# Altium footprint library Footprints.PcbLib: 236 footprints (part 7 of 15)
Each footprint in its own frame and in the unit in brackets; x right, y up, seen from the top. Pads: shape width x height; smd on the part's side, far side on the other; paste and mask are expansions set on the pad; w line width, h text height; cw(c..) or ccw(c..) is an arc to the next point about the centre after c.
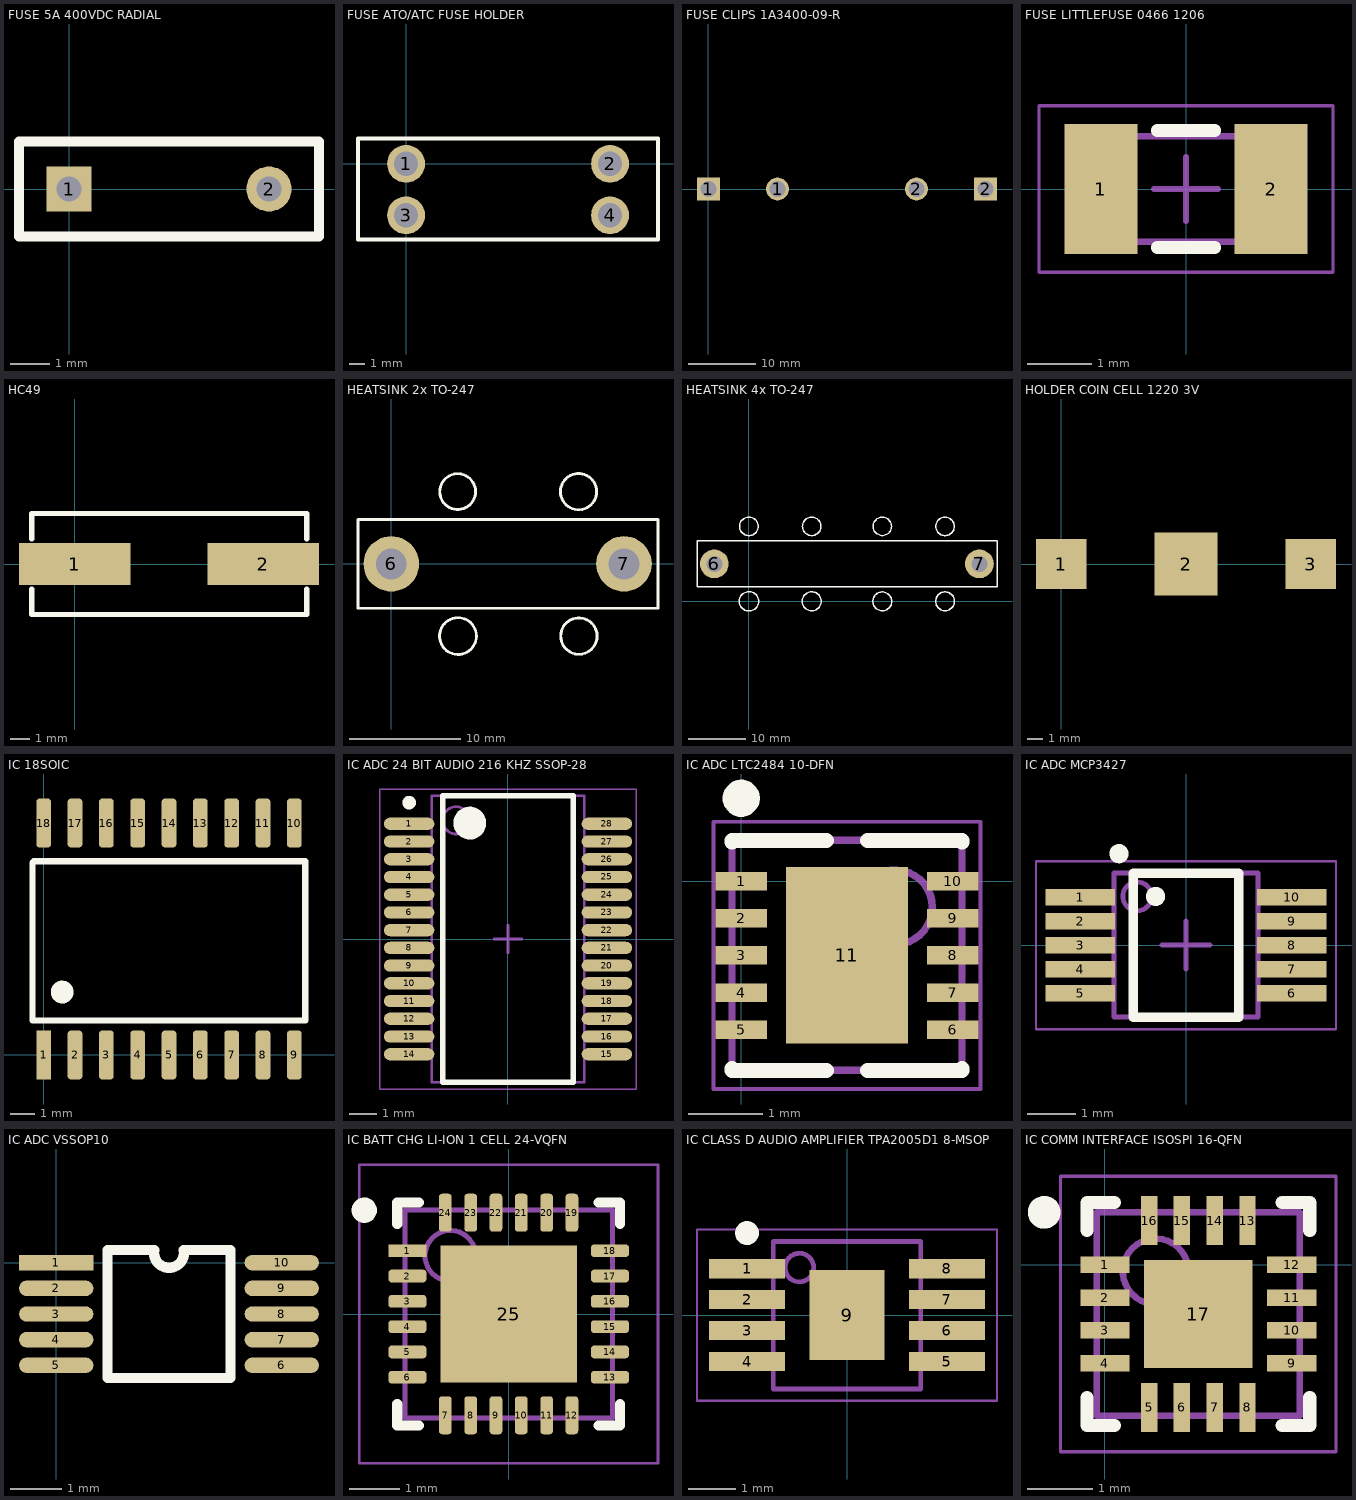
[diagram p6: the footprints below, top view; thin cyan lines are the x and y axes]

## FUSE 5A 400VDC RADIAL [mil]
pads (2):
  rect 45x45 hole 25: 1(0,0)
  round 45 hole 25: 2(200,0)
Top Overlay:
  lines w10: -50,-47.5 250,-47.5 250,47.5 -50,47.5 -50,-47.5
3D body: height 40, standoff -80, extent 190.09,-9.97 210.01,9.99
3D body: height 40, standoff -80, extent -9.91,-9.97 10.01,9.99
3D body: height 320, standoff 25, extent -55,-52.5 255,52.5

## FUSE ATO/ATC FUSE HOLDER [mm]
pads (4):
  round 2.5 hole 1.6: 1(0,0) 2(13.47,0) 3(0,-3.4) 4(13.47,-3.4)
Top Overlay:
  lines w0.254: -3.18,-4.995 16.64,-4.995 16.64,1.585 ; -3.17,-4.995 -3.17,1.665 16.64,1.665
3D body "keystone-PN3557-2.STEP": height 7.54, standoff -2.62, extent -3.234,-4.983 16.578,1.748
3D body "fuse-automotive-10a.STEP": height 19.1, standoff 0.1, extent -2.3,-4.1 15.7,0.7

## FUSE CLIPS 1A3400-09-R [mm] "FUSE CLIP CARTRIDGE 20A PCB"
pads (4):
  rect 3.4x3.4 hole 2.35: 1(0,0) 2(41.28,0)
  round 3.4 hole 2.35: 1(10.29,0) 2(30.99,0)
3D body: height 18.03, standoff 0, extent 0,-6 41.28,6

## FUSE LITTLEFUSE 0466 1206 [mm]
height 0.6
pads (2):
  rect 1.14x2.03 smd: 1(-1.33,0) 2(1.33,0)
Top Overlay:
  lines w0.2: -0.45,-0.915 0.45,-0.915 ; -0.45,0.915 0.45,0.915
Mechanical 13:
  lines w0.1: -1.65,-0.825 -1.65,0.825 1.65,0.825 1.65,-0.825 -1.65,-0.825
Mechanical 15:
  lines w0.05: -2.3,-1.3 -2.3,1.3 2.3,1.3 2.3,-1.3 -2.3,-1.3
  lines w0.1: -0.5,0 0.5,0 ; 0,-0.5 0,0.5
3D body "FUSE LITTLEFUSE 0466 1206.step": height 0.6, standoff 0, extent -1.65,-0.825 1.65,0.825

## HC49 [mm]
pads (2):
  rect 5.6x2.1 smd: 1(0,0) 2(9.5,0)
Top Overlay:
  lines w0.254: -2.159,-1.27 -2.159,-2.54 11.684,-2.54 11.684,-1.27 ; -2.159,1.27 -2.159,2.54 11.684,2.54 11.684,1.27

## HEATSINK 2x TO-247 [mm]
pads (2):
  round 5 hole 2.775: 6(0,0) 7(20.94,0)
Top Overlay:
  circle w0.254: c5.97,6.5 r1.61
  circle w0.254: c16.85,6.5 r1.629
  circle w0.254: c16.88,-6.5 r1.634
  circle w0.254: c6,-6.5 r1.655
  lines w0.254: -3,-4 -3,4 24,4 24,-4 -3,-4
3D body "omni-uni-30-25-d.stp": height 59.7, standoff -4.15, extent -2,-15.1 23,14.9

## HEATSINK 4x TO-247 [mm]
pads (2):
  round 5 hole 2.775: 6(-6,6.5) 7(39.94,6.5)
Top Overlay:
  circle w0.254: c23.12,13 r1.597
  circle w0.254: c34,13 r1.603
  circle w0.254: c34,0 r1.628
  circle w0.254: c23.12,0 r1.637
  circle w0.254: c10.88,0 r1.648
  circle w0.254: c0,0 r1.676
  circle w0.254: c10.88,13 r1.598
  circle w0.254: c0,13 r1.612
  lines w0.254: -9,2.5 -9,10.5 43,10.5 43,2.5 -9,2.5
3D body "omni-uni-30-50-d.stp": height 59.7, standoff -4.15, extent -8,-8.25 42,21.75

## HOLDER COIN CELL 1220 3V [mm] "12mm smd coin cell holder"
height 3.18
pads (3):
  rect 3.18x3.18 smd: 1(0,0) 3(15.74,0)
  rect 3.96x3.96 smd: 2(7.87,0)
3D body "keystone-PN3000.STEP": height 3.43, standoff 0.26, extent -1.604,-6.921 17.344,5.144
3D body: height 0.25, standoff 0, extent 3.1,-0.9 3.1,-0.9

## IC 18SOIC [mm]
height 2
pads (18):
  rect 0.6x2 smd: 1(0,0)
  rrect50% 0.6x2 smd: 2(1.27,0) 3(2.54,0) 4(3.81,0) 5(5.08,0) 6(6.35,0) 7(7.62,0) 8(8.89,0) 9(10.16,0) 10(10.16,9.4) 11(8.89,9.4) 12(7.62,9.4) 13(6.35,9.4) 14(5.08,9.4) 15(3.81,9.4) 16(2.54,9.4) 17(1.27,9.4) 18(0,9.4)
Top Overlay:
  circle w0.254: c0.75,2.55 r0.1
  circle w0.254: c0.75,2.55 r0.335
  lines w0.254: -0.45,7.8 -0.45,1.4 10.6,1.4 10.6,7.85 -0.4,7.85
3D body "SOIC18 wide.stp": height 2, standoff 0, extent -0.625,-0.382 10.725,9.782

## IC ADC 24 BIT AUDIO 216 KHZ SSOP-28 [mm] "SOP, 28-Leads, Body 10.20x5.30mm, Pitch 0.65mm, IPC Medium Density"
height 2
pads (28):
  oval 1.85x0.45 smd: 1(-3.625,4.225) 2(-3.625,3.575) 3(-3.625,2.925) 4(-3.625,2.275) 5(-3.625,1.625) 6(-3.625,0.975) 7(-3.625,0.325) 8(-3.625,-0.325) 9(-3.625,-0.975) 10(-3.625,-1.625) 11(-3.625,-2.275) 12(-3.625,-2.925) 13(-3.625,-3.575) 14(-3.625,-4.225) 15(3.625,-4.225) 16(3.625,-3.575) 17(3.625,-2.925) 18(3.625,-2.275) 19(3.625,-1.625) 20(3.625,-0.975) 21(3.625,-0.325) 22(3.625,0.325) 23(3.625,0.975) 24(3.625,1.625) 25(3.625,2.275) 26(3.625,2.925) 27(3.625,3.575) 28(3.625,4.225)
Top Overlay:
  circle w0.25: c-3.625,5 r0.125
  circle w0.6: c-1.4,4.25 r0.3
  lines w0.2: -2.4,-5.25 -2.4,5.25 2.4,5.25 2.4,-5.25 -2.4,-5.25
Assembly Top (Mech9):
  circle w0.1: c-1.9,4.35 r0.5
  lines w0.1: -2.8,-5.25 -2.8,5.25 2.8,5.25 2.8,-5.25 -2.8,-5.25
Courtyard Top (Mech11):
  lines w0.05: -4.7,-5.5 -4.7,5.5 4.7,5.5 4.7,-5.5 -4.7,-5.5
  lines w0.1: -0.5,0 0.5,0 ; 0,-0.5 0,0.5
3D body "IC ADC 24 BIT AUDIO 216 KHZ SSOP-28.step": height 2, standoff 0, extent -3.9,-5.25 3.9,5.25

## IC ADC LTC2484 10-DFN [mm]
height 0.8
pads (11):
  rect 0.7x0.25 smd: 1(0,0) 2(0,-0.5) 3(0,-1) 4(0,-1.5) 5(0,-2) 6(2.85,-2) 7(2.85,-1.5) 8(2.85,-1) 9(2.85,-0.5) 10(2.85,0)
  rect 1.65x2.38 smd: 11(1.425,-1)
Top Overlay:
  circle w0.25: c0,1.118 r0.125
  lines w0.2: -0.125,-2.525 -0.125,-2.55 1.15,-2.55 ; -0.125,0.525 -0.125,0.55 1.15,0.55 ; 1.7,-2.55 2.975,-2.55 2.975,-2.525 ; 1.7,0.55 2.975,0.55 2.975,0.525
Mechanical 13:
  circle w0.1: c2.075,-0.35 r0.5
  lines w0.1: -0.125,-2.55 -0.125,0.55 2.975,0.55 2.975,-2.55 -0.125,-2.55
Mechanical 15:
  lines w0.05: -0.375,-2.8 -0.375,0.8 3.225,0.8 3.225,-2.8 -0.375,-2.8
  lines w0.1: 0.925,-1 1.925,-1 ; 1.425,-1.5 1.425,-0.5
3D body "IC ADC LTC2484 10-DFN.step": height 0.8, standoff 0, extent -0.125,-2.55 2.975,0.55

## IC ADC MCP3427 [mm]
height 1.1
pads (10):
  rect 1.45x0.345 smd: 1(-2.2,1) 2(-2.2,0.5) 3(-2.2,0) 4(-2.2,-0.5) 5(-2.2,-1) 6(2.2,-1) 7(2.2,-0.5) 8(2.2,0) 9(2.2,0.5) 10(2.2,1)
Top Overlay:
  circle w0.2: c-1.397,1.905 r0.1
  circle w0.2: c-0.635,1.016 r0.1
  lines w0.2: -1.1,-1.5 -1.1,1.5 1.1,1.5 1.1,-1.5 -1.1,-1.5
Mechanical 13:
  circle w0.1: c-1.016,1.016 r0.3
  lines w0.1: -1.5,-1.5 -1.5,1.5 1.5,1.5 1.5,-1.5 -1.5,-1.5
Mechanical 15:
  lines w0.05: -3.125,-1.75 -3.125,1.75 3.125,1.75 3.125,-1.75 -3.125,-1.75
  lines w0.1: -0.5,0 0.5,0 ; 0,-0.5 0,0.5
3D body "STL?STL?STEP?MSOP10_MC-M.step": height 1.09, standoff 0, extent -2.451,-1.499 2.451,1.499

## IC ADC VSSOP10 [mm]
pads (10):
  rect 1.45x0.3 smd: 1(0,0)
  oval 1.45x0.3 smd: 2(0,-0.5) 3(0,-1) 4(0,-1.5) 5(0,-2) 6(4.4,-2) 7(4.4,-1.5) 8(4.4,-1) 9(4.4,-0.5) 10(4.4,0)
Top Overlay:
  lines w0.2: 1.914,0.246 ccw(c2.2,0.191) 2.486,0.246 ; 1.914,0.25 1,0.25 1,-2.25 3.4,-2.25 3.4,0.25 2.486,0.25
3D body "MSOP-10.stp": height 1.15, standoff 0, extent -0.25,-2.5 4.65,0.5

## IC BATT CHG LI-ION 1 CELL 24-VQFN [mm]
height 1
pads (25):
  rect 0.75x0.25 smd: 1(-2,1.25)
  rrect50% 0.75x0.25 smd: 2(-2,0.75) 3(-2,0.25) 4(-2,-0.25) 5(-2,-0.75) 6(-2,-1.25) 13(2,-1.25) 14(2,-0.75) 15(2,-0.25) 16(2,0.25) 17(2,0.75) 18(2,1.25)
  rrect50% 0.25x0.75 smd: 7(-1.25,-2) 8(-0.75,-2) 9(-0.25,-2) 10(0.25,-2) 11(0.75,-2) 12(1.25,-2) 19(1.25,2) 20(0.75,2) 21(0.25,2) 22(-0.25,2) 23(-0.75,2) 24(-1.25,2)
  rect 2.7x2.7 smd: 25(0,0)
Top Overlay:
  circle w0.25: c-2.85,2.05 r0.125
  lines w0.2: -2.2,-1.775 -2.2,-2.2 -1.775,-2.2 ; -2.2,1.775 -2.2,2.2 -1.775,2.2 ; 1.775,-2.2 2.2,-2.2 2.2,-1.775 ; 1.775,2.2 2.2,2.2 2.2,1.775
Assembly Top (Mech9):
  circle w0.1: c-1.15,1.15 r0.5
  lines w0.1: -2.05,-2.05 -2.05,2.05 2.05,2.05 2.05,-2.05 -2.05,-2.05
Courtyard Top (Mech11):
  lines w0.05: -2.95,-2.95 -2.95,2.95 2.95,2.95 2.95,-2.95 -2.95,-2.95
  lines w0.1: -0.5,0 0.5,0 ; 0,-0.5 0,0.5
3D body "IC BATT CHG LI-ION 1 CELL 24-VQFN.step": height 1, standoff 0, extent -2.13,-2.13 2.13,2.13

## IC CLASS D AUDIO AMPLIFIER TPA2005D1 8-MSOP [mm]
pads (9):
  rect 1.6x0.4 smd: 1(-2.1,0.975) 2(-2.1,0.325) 3(-2.1,-0.325) 4(-2.1,-0.975) 5(2.1,-0.975) 6(2.1,-0.325) 7(2.1,0.325) 8(2.1,0.975)
  rect 1.57x1.89 smd: 9(0,0)
Top Overlay:
  circle w0.25: c-2.1,1.725 r0.125
Mechanical 13:
  circle w0.1: c-1,1 r0.3
  lines w0.1: -1.55,-1.55 -1.55,1.55 1.55,1.55 1.55,-1.55 -1.55,-1.55
Mechanical 15:
  lines w0.05: -3.15,-1.8 -3.15,1.8 3.15,1.8 3.15,-1.8 -3.15,-1.8
  lines w0.1: -0.5,0 0.5,0 ; 0,-0.5 0,0.5
3D body "DGN0008D.stp": height 1.05, standoff -0.02, extent -2.45,-1.5 2.45,1.5

## IC COMM INTERFACE ISOSPI 16-QFN [mm] "16-WFQFN Exposed Pad"
height 0.8
pads (17):
  rect 0.75x0.25 smd: 1(0,0) 2(0,-0.5) 3(0,-1) 4(0,-1.5) 9(2.85,-1.5) 10(2.85,-1) 11(2.85,-0.5) 12(2.85,0)
  rect 0.25x0.75 smd: 5(0.675,-2.175) 6(1.175,-2.175) 7(1.675,-2.175) 8(2.175,-2.175) 13(2.175,0.675) 14(1.675,0.675) 15(1.175,0.675) 16(0.675,0.675)
  rect 1.65x1.65 smd: 17(1.425,-0.75)
Top Overlay:
  circle w0.25: c-0.925,0.8 r0.125
  lines w0.2: -0.275,-2.025 -0.275,-2.45 0.15,-2.45 ; -0.275,0.525 -0.275,0.95 0.15,0.95 ; 2.7,-2.45 3.125,-2.45 3.125,-2.025 ; 2.7,0.95 3.125,0.95 3.125,0.525
Mechanical 13:
  circle w0.1: c0.775,-0.1 r0.5
  lines w0.1: -0.125,-2.3 -0.125,0.8 2.975,0.8 2.975,-2.3 -0.125,-2.3
Mechanical 15:
  lines w0.05: -0.675,-2.85 -0.675,1.35 3.525,1.35 3.525,-2.85 -0.675,-2.85
  lines w0.1: 0.925,-0.75 1.925,-0.75 ; 1.425,-1.25 1.425,-0.25
3D body "IC COMM INTERFACE ISOSPI 16-QFN  .step": height 0.8, standoff 0, extent -0.175,-2.35 3.025,0.85